# Altium footprint library VNGS01 V1.31.PcbLib: 36 footprints (part 1 of 3)
Each footprint in its own frame and in the unit in brackets; x right, y up, seen from the top. Pads: shape width x height; smd on the part's side, far side on the other; paste and mask are expansions set on the pad; w line width, h text height; cw(c..) or ccw(c..) is an arc to the next point about the centre after c.
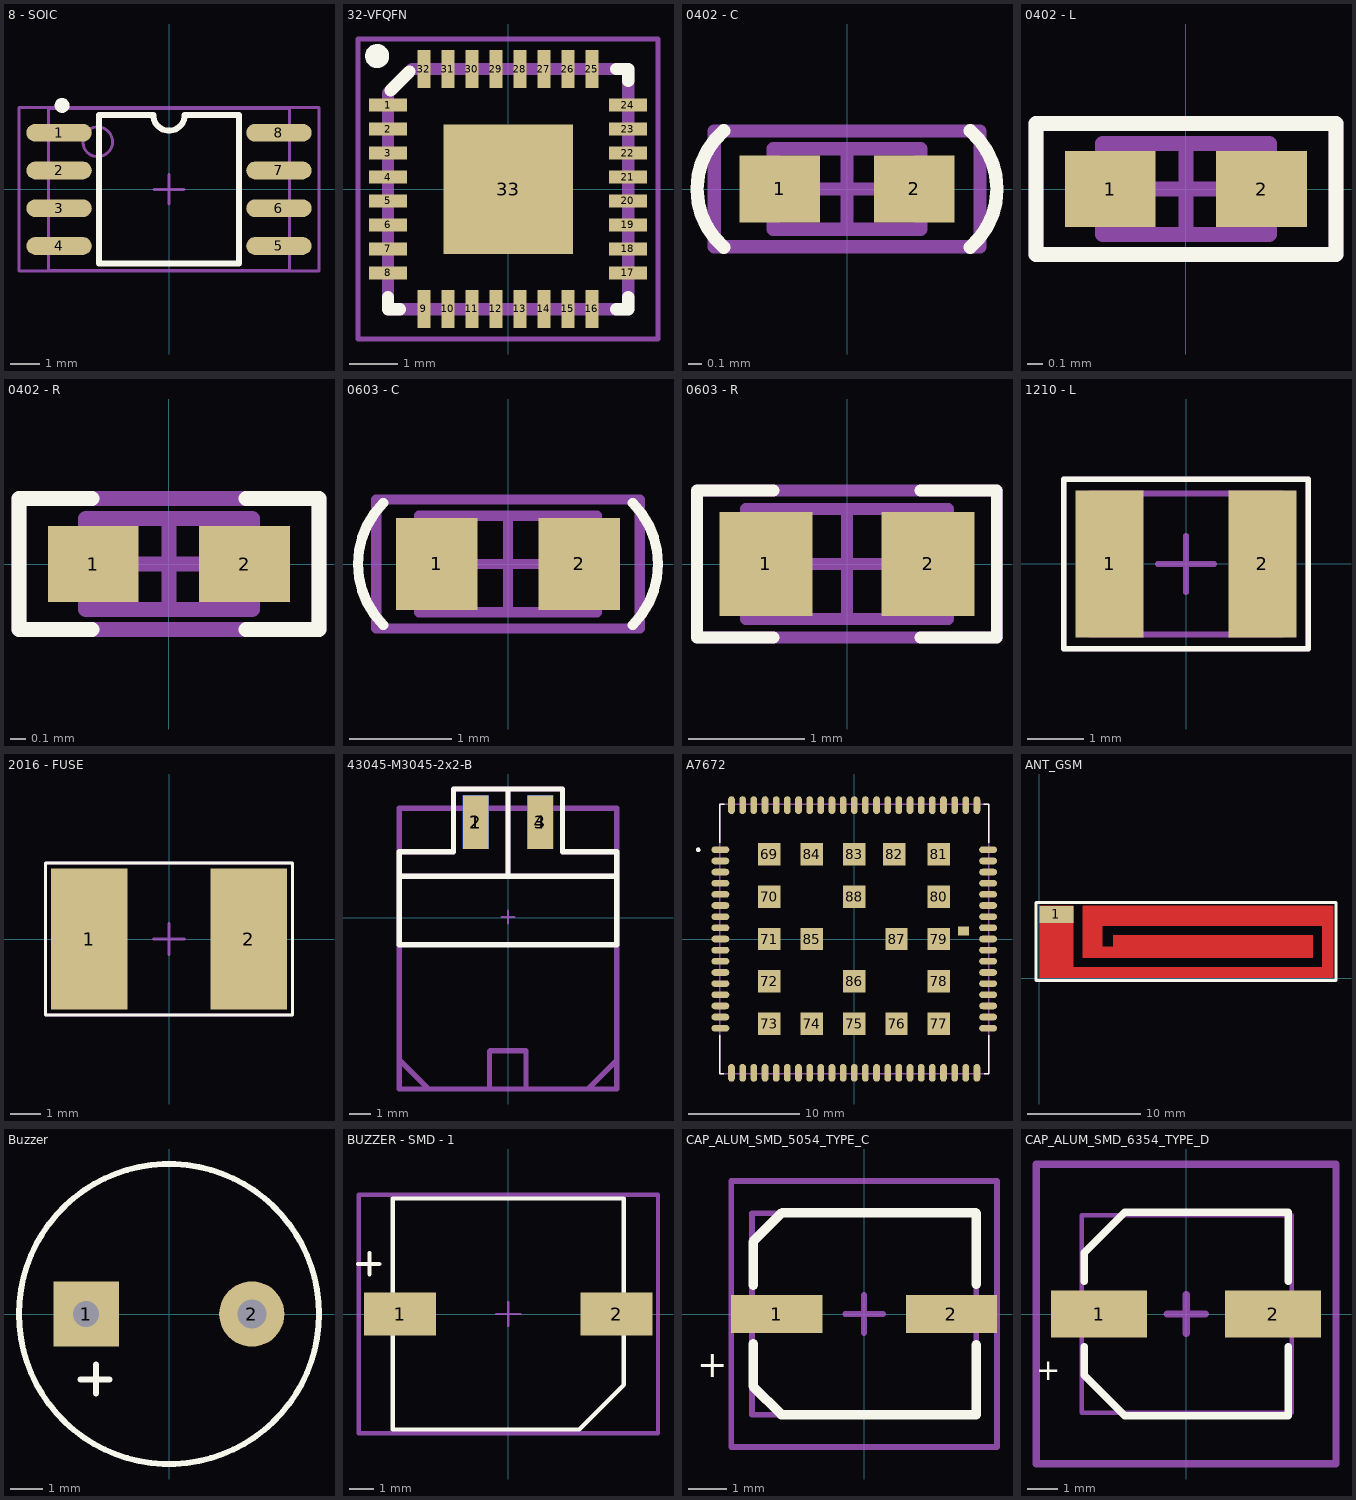
[diagram p0: the footprints below, top view; thin cyan lines are the x and y axes]

## 8 - SOIC [mm] "SOIC, 8-Leads, Body 5.3x3.9mm, Pitch 1.27mm, IPC Medium Density"
height 1.75
pads (8):
  oval 2.2x0.6 smd: 1(-3.7,1.905) 2(-3.7,0.635) 3(-3.7,-0.635) 4(-3.7,-1.905) 5(3.7,-1.905) 6(3.7,-0.635) 7(3.7,0.635) 8(3.7,1.905)
Top Overlay:
  circle w0.25: c-3.6,2.825 r0.125
  lines w0.2: -2.35,-2.5 -2.35,2.5 ; -2.35,-2.5 2.325,-2.5 ; -2.35,2.5 -0.528,2.5 ccw(c0,2.5) 0.527,2.5 2.35,2.5 2.35,-2.5
Mechanical 13:
  circle w0.1: c-2.4,1.6 r0.5
  lines w0.1: -4.05,-2.725 -4.05,2.725 4.05,2.725 4.05,-2.725 -4.05,-2.725
Mechanical 15:
  lines w0.1: -0.5,0 0.5,0 ; 0,-0.5 0,0.5 ; -5.05,-2.75 -5.05,2.75 5.05,2.75 5.05,-2.75 -5.05,-2.75
3D body "User Library-SOIC8_Wide_5mmx5mm.STEP": height 1.75, standoff -0.01, extent -4.077,-2.73 4.025,2.73

## 32-VFQFN [mil] "VFQFN, 32-lead, Body 5x5 mm, 0.5 mm pitch,IPC High Density"
height 35.43
pads (33):
  rect 31.5x11 smd mask+4.5: 1(-98.42,68.89) 2(-98.42,49.21) 3(-98.42,29.53) 4(-98.42,9.84) 5(-98.42,-9.84) 6(-98.42,-29.52) 7(-98.42,-49.21) 8(-98.42,-68.89) 17(98.43,-68.89) 18(98.43,-49.21) 19(98.43,-29.52) 20(98.43,-9.84) 21(98.43,9.84) 22(98.43,29.53) 23(98.43,49.21) 24(98.43,68.89)
  rect 11x31.5 smd mask+4.5: 9(-68.91,-98.42) 10(-49.22,-98.42) 11(-29.54,-98.42) 12(-9.86,-98.42) 13(9.83,-98.42) 14(29.51,-98.42) 15(49.19,-98.42) 16(68.88,-98.42) 25(68.88,98.43) 26(49.19,98.43) 27(29.51,98.43) 28(9.83,98.43) 29(-9.86,98.43) 30(-29.54,98.43) 31(-49.22,98.43) 32(-68.91,98.43)
  rect 106.3x106.3 smd paste-118.11: 33(0.08,-0.06)
Top Overlay:
  circle w9.84: c-107.28,109.06 r4.92
  lines w10: -98.42,-88.71 -98.42,-98.56 -88.57,-98.56 ; -96.47,80.69 -80.74,96.43 ; 88.73,-98.56 98.58,-98.56 98.58,-88.71 ; 88.73,98.44 98.58,98.44 98.58,88.59
Top Paste:
  region: -3.94,-3.94 -51,-3.94 -51,-51 -3.94,-51
  region: 3.95,-4.07 3.95,-51.13 51.02,-51.13 51.02,-4.07
  rectangle: 4.09,3.82 51.15,50.88
  region: -3.8,3.95 -3.8,51.02 -50.87,51.02 -50.87,3.95
Mechanical 13:
  lines w10: -98.42,-98.56 98.58,-98.56 98.58,98.44 -78.72,98.44 -98.42,78.74 -98.42,-98.56
Mechanical 15:
  lines w3.94: -19.68,0 19.69,0 ; 0,-19.68 0,19.68 ; -123.03,-123.03 123.03,-123.03 123.03,123.03 -123.03,123.03 -123.03,-123.03
3D body "User Library-QFN-32UH.STEP": height 29.53, standoff 0, extent -98.81,-98.81 98.83,98.83

## 0402 - C [mm] "Chip Capacitor, Body 1.0x0.5mm, IPC High Density"
height 1.3
pads (2):
  rect 0.6x0.5 smd: 1(-0.5,0) 2(0.5,0)
Top Overlay:
  lines w0.1: -0.917,-0.434 cw(c-0.548,0) -0.917,0.434 ; 0.917,-0.434 ccw(c0.548,0) 0.917,0.434
Mechanical 13:
  lines w0.1: -0.55,-0.3 0.55,-0.3 0.55,0.3 -0.55,0.3 -0.55,-0.3
Mechanical 15:
  lines w0.1: -0.3,0 0.3,0 ; 0,-0.3 0,0.3 ; -0.991,-0.432 -0.991,0.432 0.991,0.432 0.991,-0.432 -0.991,-0.432
3D body "CAP - 0402.STEP": height 0.36, standoff 0, extent -0.5,-0.265 0.5,0.265

## 0402 - L [mm] "Chip Inductor, Body 1.0x0.5mm, IPC High Density"
height 1.3
pads (2):
  rect 0.6x0.5 smd: 1(-0.5,0) 2(0.5,0)
Top Overlay:
  lines w0.1: -0.991,-0.432 -0.991,0.432 0.991,0.432 0.991,-0.432 -0.991,-0.432 ; -0.508,0.432 ccw(c-0.508,0.432) -0.508,0.432
Mechanical 13:
  lines w0.1: -0.55,-0.3 -0.55,0.3 0.55,0.3 0.55,-0.3 -0.55,-0.3
Mechanical 15:
  lines w0.1: -0.3,0 0.3,0 ; 0,-0.3 0,0.3 ; -0.991,-0.432 0.991,-0.432 0.991,0.432 -0.991,0.432 -0.991,-0.432
3D body "INDUCTOR - 0402.STEP": height 0.25, standoff 0, extent -0.5,-0.25 0.5,0.25

## 0402 - R [mm] "Chip Resistor, Body 1.0x0.5mm, IPC High Density"
height 1.3
pads (2):
  rect 0.6x0.5 smd: 1(-0.5,0) 2(0.5,0)
Top Overlay:
  lines w0.1: -0.508,-0.432 -0.991,-0.432 -0.991,0.432 -0.508,0.432 ; 0.509,-0.432 0.991,-0.432 0.991,0.432 0.509,0.432 ; -0.508,0.432 ccw(c-0.508,0.432) -0.508,0.432
Mechanical 13:
  lines w0.1: -0.55,-0.3 0.55,-0.3 0.55,0.3 -0.55,0.3 -0.55,-0.3
Mechanical 15:
  lines w0.1: -0.3,0 0.3,0 ; 0,-0.3 0,0.3 ; -0.991,-0.432 -0.991,0.432 0.991,0.432 0.991,-0.432 -0.991,-0.432
3D body "RES - 0402.STEP": height 0.35, standoff 0, extent -0.5,-0.25 0.5,0.25

## 0603 - C [mm] "Chip Capacitor, Body 1.6x0.8mm, IPC High Density"
height 1.3
pads (2):
  rect 0.8x0.9 smd: 1(-0.7,0) 2(0.7,0)
Top Overlay:
  lines w0.1: -1.226,-0.6 cw(c-0.626,0) -1.226,0.6 ; 1.226,-0.6 ccw(c0.626,0) 1.226,0.6
Mechanical 13:
  lines w0.1: -0.875,-0.475 0.875,-0.475 0.875,0.475 -0.875,0.475 -0.875,-0.475
Mechanical 15:
  lines w0.1: -0.475,0 0.475,0 ; 0,-0.475 0,0.475 ; -1.295,-0.635 1.295,-0.635 1.295,0.635 -1.295,0.635 -1.295,-0.635
3D body "CAP_0603_1608.STEP": height 0.8, standoff 0, extent -0.8,-0.4 0.8,0.4

## 0603 - R [mm] "Chip Resistor, Body 1.6x0.8mm, IPC High Density"
height 1.3
pads (2):
  rect 0.8x0.9 smd paste-0.025: 1(-0.7,0) 2(0.7,0)
Top Overlay:
  lines w0.1: -0.635,-0.635 -1.295,-0.635 -1.295,0.635 -0.635,0.635 ; 0.635,-0.635 1.295,-0.635 1.295,0.635 0.635,0.635
Mechanical 13:
  lines w0.1: -0.875,-0.475 0.875,-0.475 0.875,0.475 -0.875,0.475 -0.875,-0.475
Mechanical 15:
  lines w0.1: -0.475,0 0.475,0 ; 0,-0.475 0,0.475 ; -1.295,-0.635 1.295,-0.635 1.295,0.635 -1.295,0.635 -1.295,-0.635
3D body "RES - 0603 - 1608X05N.STEP": height 0.45, standoff 0, extent -0.775,-0.425 0.775,0.425

## 1210 - L [mm] "Chip Capacitor, Body 2.54x1.27mm, IPC High Density"
height 1.3
pads (2):
  rect 1.2x2.6 smd: 1(-1.35,0) 2(1.35,0)
Top Overlay:
  lines w0.1: -2.159,-1.499 -2.159,1.499 2.159,1.499 2.159,-1.499 -2.159,-1.499
Mechanical 13:
  lines w0.1: -1.7,-1.245 1.7,-1.245 1.7,1.245 -1.7,1.245 -1.7,-1.245
Mechanical 15:
  lines w0.1: -0.5,0 0.5,0 ; 0,-0.5 0,0.5 ; -2.159,-1.499 -2.159,1.499 2.159,1.499 2.159,-1.499 -2.159,-1.499
3D body "User Library-3225.STEP": height 1.9, standoff 0, extent -1.6,-1.25 1.6,1.25

## 2016 - FUSE [mm] "Chip Resetable Fuse,  Body 5.1x4.2mm, IPC High Density"
height 1.4
pads (2):
  rect 2.5x4.6 smd: 1(-2.6,0) 2(2.6,0)
Top Overlay:
  lines w0.1: -4.039,-2.489 4.039,-2.489 4.039,2.489 -4.039,2.489 -4.039,-2.489
Mechanical 15:
  lines w0.1: -0.5,0 0.5,0 ; 0,-0.5 0,0.5 ; -4.039,-2.489 -4.039,2.489 4.039,2.489 4.039,-2.489 -4.039,-2.489
3D body "User Library-Fuse 2016L.step": height 2, standoff -0.03, extent -2.72,-2.255 2.72,2.255

## 43045-M3045-2x2-B [mm] "Micro-Fit 3.0™ Vertical Angle Header, 3.00mm Pitch, Dual Row, 4 Circuits, with Solder Tab, Gold, Glow Wire Capable, Black"
height 7.37
pads (4):
  rect 1.2x2.5 smd far side: 1(-1.5,4.445) 3(1.5,4.445)
  rect 1.2x2.5 smd: 2(-1.5,4.445) 4(1.5,4.445)
Top Overlay:
  lines w0.254: 0,1.922 0,5.992 ; -5.08,1.922 -5.08,3.071 -2.54,3.071 -2.54,5.992 2.54,5.992 2.54,3.071 5.08,3.071 5.08,1.922 ; -5.08,1.922 -5.08,-1.27 5.08,-1.27 5.08,1.922 ; -5.08,1.922 5.08,1.922
Bottom Overlay:
  lines w0.254: 0,1.922 0,5.992 ; -5.08,1.922 -5.08,3.071 -2.54,3.071 -2.54,5.992 2.54,5.992 2.54,3.071 5.08,3.071 5.08,1.922 ; -5.08,1.922 -5.08,-1.27 5.08,-1.27 5.08,1.922 ; -5.08,1.922 5.08,1.922
Mechanical 13:
  lines w0.254: -5.08,-2.636 -5.08,-6.624 ; -5.08,-2.611 -5.08,1.922 ; 0,1.922 0,5.992 ; 5.08,-2.459 5.08,-6.65 ; -5.08,-6.624 -3.708,-7.996 ; -5.08,-6.624 -5.08,-2.484 -5.08,1.922 ; -5.08,-6.624 -3.708,-7.996 ; -5.08,1.922 -5.08,3.071 -2.54,3.071 -2.54,5.992 2.54,5.992 2.54,3.071 5.08,3.071 5.08,1.922 ; -5.08,1.922 5.08,1.922 ; -5.08,1.922 5.08,1.922 ; -3.708,-7.996 3.734,-7.996 ; -3.708,-7.996 3.734,-7.996 ; -0.864,-7.996 0.787,-7.996 ; -0.864,-7.996 -0.864,-6.243 ; -0.864,-7.996 0.787,-7.996 ; -0.864,-7.996 -0.864,-6.243 ; -0.864,-6.243 -0.838,-6.218 ; -0.864,-6.243 -0.838,-6.218 ; -0.838,-6.218 0.838,-6.218 ; -0.838,-6.218 0.838,-6.218 ; 0.787,-7.996 0.838,-7.945 ; 0.787,-7.996 0.838,-7.945 ; 0.838,-7.945 0.838,-6.218 ; 0.838,-7.945 0.838,-6.218 ; 3.734,-7.996 5.08,-6.65 ; 3.734,-7.996 5.08,-6.65 ; 5.08,-6.65 5.08,-2.484 ; 5.08,-2.484 5.08,1.922 ; 5.08,-2.484 5.08,1.922
Mechanical 15:
  lines w0.1: -0.3,0.023 0.3,0.023 ; 0,-0.277 0,0.323
  lines w0.254: -5.08,4.976 -5.08,-7.996 5.08,-7.996 5.08,4.976 ; -5.08,5.102 5.08,5.102
3D body "m3045-2x2_asm.stp": height 3.62, standoff -5.2, extent -4.86,-7.972 4.86,5.685

## A7672 [mm]
height 1.3
pads (101):
  oval 1.6x0.6 smd: 1(-12,8) 2(-12,7) 3(-12,6) 4(-12,5) 5(-12,4) 6(-12,3) 7(-12,2) 8(-12,1) 9(-12,0) 10(-12,-1) 11(-12,-2) 12(-12,-3) 13(-12,-4) 14(-12,-5) 15(-12,-6) 16(-12,-7) 17(-12,-8) 35(12,-8) 36(12,-7) 37(12,-6) 38(12,-5) 39(12,-4) 40(12,-3) 41(12,-2) 42(12,-1) 43(12,0) 44(12,1) 45(12,2) 46(12,3) 47(12,4) 48(12,5) 49(12,6) 50(12,7) 51(12,8)
  oval 0.6x1.6 smd: 18(-8,-12) 19(-7,-12) 20(-6,-12) 21(-5,-12) 22(-4,-12) 23(-3,-12) 24(-2,-12) 25(-1,-12) 26(0,-12) 27(1,-12) 28(2,-12) 29(3,-12) 30(4,-12) 31(5,-12) 32(6,-12) 33(7,-12) 34(8,-12) 52(8,12) 53(7,12) 54(6,12) 55(5,12) 56(4,12) 57(3,12) 58(2,12) 59(1,12) 60(0,12) 61(-1,12) 62(-2,12) 63(-3,12) 64(-4,12) 65(-5,12) 66(-6,12) 67(-7,12) 68(-8,12) 89(-11.01,-12) 90(-10.01,-12) 91(-9,-12) 92(9,-12) 93(10,-12) 94(11,-12) 95(11,12) 96(10,12) 97(9,12) 98(-9.01,12) 99(-10.01,12) 100(-11.01,12)
  rect 2x2 smd: 69(-7.611,7.6) 70(-7.611,3.8) 71(-7.611,0) 72(-7.611,-3.8) 73(-7.611,-7.6) 74(-3.811,-7.6) 75(-0.011,-7.6) 76(3.789,-7.6) 77(7.589,-7.6) 78(7.589,-3.8) 79(7.589,0) 80(7.589,3.8) 81(7.589,7.6) 82(3.589,7.6) 83(-0.011,7.6) 84(-3.811,7.6) 85(-3.811,0) 86(-0.011,-3.8) 87(3.789,0) 88(-0.011,3.8)
  rect 1x0.8 smd: 116(9.79,0.7)
Top Overlay:
  circle w0.2: c-14,8 r0.1
  lines w0.127: -12.075,-8.62 -12.075,-12.075 -11.695,-12.075 ; -12.075,8.62 -12.075,12.075 -11.67,12.075 ; 11.622,12.075 12.075,12.075 12.075,8.62 ; 11.673,-12.075 12.075,-12.075 12.075,-8.62
Mechanical 13:
  circle w0.2: c-14,8 r0.1
  lines w0.127: -12.075,-12.075 12.075,-12.075 12.075,12.075 -12.075,12.075 -12.075,-12.075
3D body "SIM7672_3.step": height 3.02, standoff 0, extent -12.015,-11.926 11.99,12.079

## ANT_GSM [mm] "Antenna GSM PCB"
height 1.035
pads (1):
  rect 3x1.5 smd mask+0.102: 1(1.5,5.64)
Top Layer:
  rectangle: 6.5,1.8 24.2,3.8
  rectangle: 3.8,1.8 5.6,6.4
  rectangle: 3.8,4.6 26,6.4
  rectangle: 25,0 26,6.4
  rectangle: 0,0 3,6.4
  rectangle: 0,0 26,1
  rectangle: 3.8,1.801 24.2,2.801
Top Overlay:
  lines w0.254: -0.3,-0.22 26.22,-0.22 26.22,6.68 -0.3,6.68 -0.3,-0.22

## Buzzer [mm] "Buzer 9mm"
height 12.7
pads (2):
  rect 2x2 hole 0.8: 1(-2.54,0)
  round 2 hole 0.889: 2(2.54,0)
Top Overlay:
  circle w0.178: c0,0 r4.6
  lines w0.178: -2.718,-2.007 -1.829,-2.007 ; -2.235,-2.438 -2.235,-1.549
3D body "Buzzer_9mm.STEP": height 5.6, standoff -5.4, extent -4.55,-4.55 4.55,4.55

## BUZZER - SMD - 1 [mm] "Buzer 9mm, SMD"
height 4.5
pads (2):
  rect 3x1.8 smd: 1(-4.5,0) 2(4.5,0)
Top Overlay:
  lines w0.178: -6.248,2.083 -5.359,2.083 ; -5.766,1.651 -5.766,2.54 ; -4.8,-4.8 -4.8,4.8 4.8,4.8 4.8,-2.947 2.947,-4.8 -4.8,-4.8
Mechanical 15:
  lines w0.1: -0.5,0 0.5,0 ; 0,-0.5 0,0.5
  lines w0.178: -6.223,-4.953 6.223,-4.953 6.223,4.953 -6.223,4.953 -6.223,-4.953
3D body "CMI-9653S-SMT.stp": height 4.85, standoff -0.15, extent -5,-4.8 5,4.8

## CAP_ALUM_SMD_5054_TYPE_C [mm]
pads (2):
  rect 2.4x1 smd paste-0.05: 1(-2.3,0) 2(2.3,0)
Top Overlay:
  lines w0.254: -2.921,-0.787 -2.921,-1.905 -2.176,-2.65 2.95,-2.65 2.95,-0.813 ; -2.921,0.762 -2.921,1.905 -2.159,2.667 2.932,2.667 ; 2.95,0.787 2.95,2.65
  text "+" at -4.4,-1.9 h1.2
Top Courtyard:
  lines w0.15: -3.5,-3.5 3.5,-3.5 3.5,3.5 -3.5,3.5 -3.5,-3.5
  text ".Designator" at -1,-0.6 h1.2
Top 3D Body:
  lines w0.15: -0.5,0 0.5,0 ; 0,-0.5 0,0.5 ; -2.95,-2.65 -2.95,2.65 2.95,2.65 2.95,-2.65 -2.95,-2.65
3D body "User Library-ALU-C.STEP": height 5.41, standoff 0, extent -2.95,-2.65 2.95,2.65

## CAP_ALUM_SMD_6354_TYPE_D [mm] "Capacitor, Aluminum Electrolytic; 6.60 mm L X 6.60 mm W X 5.40 mm H body"
height 5.4
pads (2):
  rect 3.2x1.58 smd paste-0.1: 1(-2.9,0) 2(2.9,0)
Top Overlay:
  lines w0.25: -3.4,-1.092 -3.4,-2.04 -2.04,-3.4 3.4,-3.4 3.4,-1.092 ; -3.4,1.092 -3.4,2.04 -2.04,3.4 3.4,3.4 3.4,1.092
  text "+" at -5.008,-2.449 h1.2
Top Courtyard:
  lines w0.25: -5,-5 5,-5 5,5 -5,5 -5,-5
  text ".Designator" at -4.064,-0.889 h1.2
Top 3D Body:
  lines w0.15: -3.475,-3.3 3.525,-3.3 3.525,3.3 -3.475,3.3 -3.475,-3.3
  lines w0.25: -0.635,0 0.635,0 ; 0,-0.635 0,0.635
3D body "CAPAE660X540D780L260X65.STEP": height 5.4, standoff 0, extent -3.475,-3.3 3.525,3.3